# Altium footprint library 采集系统专用库.PcbLib: 18 footprints (part 2 of 2)
Each footprint in its own frame and in the unit in brackets; x right, y up, seen from the top. Pads: shape width x height; smd on the part's side, far side on the other; paste and mask are expansions set on the pad; w line width, h text height; cw(c..) or ccw(c..) is an arc to the next point about the centre after c.
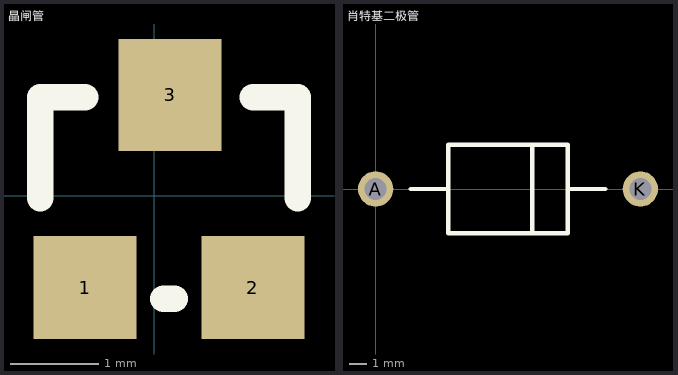
[diagram p1: the footprints below, top view; thin cyan lines are the x and y axes]

## 晶闸管 [mil]
pads (3):
  rect 46x46 smd: 1(-31,-41) 2(44,-41)
  rect 46x50 smd: 3(7,45)
Top Overlay:
  lines w12: -51,-1 -51,44 -31,44 ; 4,-46 9,-46 ; 44,44 64,44 64,-1

## 肖特基二极管 [mil]
pads (2):
  round 80 hole 50: A(0,0) K(600,0)
Top Overlay:
  lines w10: 80,0 165,0 ; 355,-100 355,100 ; 435,0 520,0 ; 165,0 165,-100 435,-100 435,100 165,100 165,0